# Altium footprint library SMT.PcbLib: 151 footprints (part 1 of 10)
Each footprint in its own frame and in the unit in brackets; x right, y up, seen from the top. Pads: shape width x height; smd on the part's side, far side on the other; paste and mask are expansions set on the pad; w line width, h text height; cw(c..) or ccw(c..) is an arc to the next point about the centre after c.
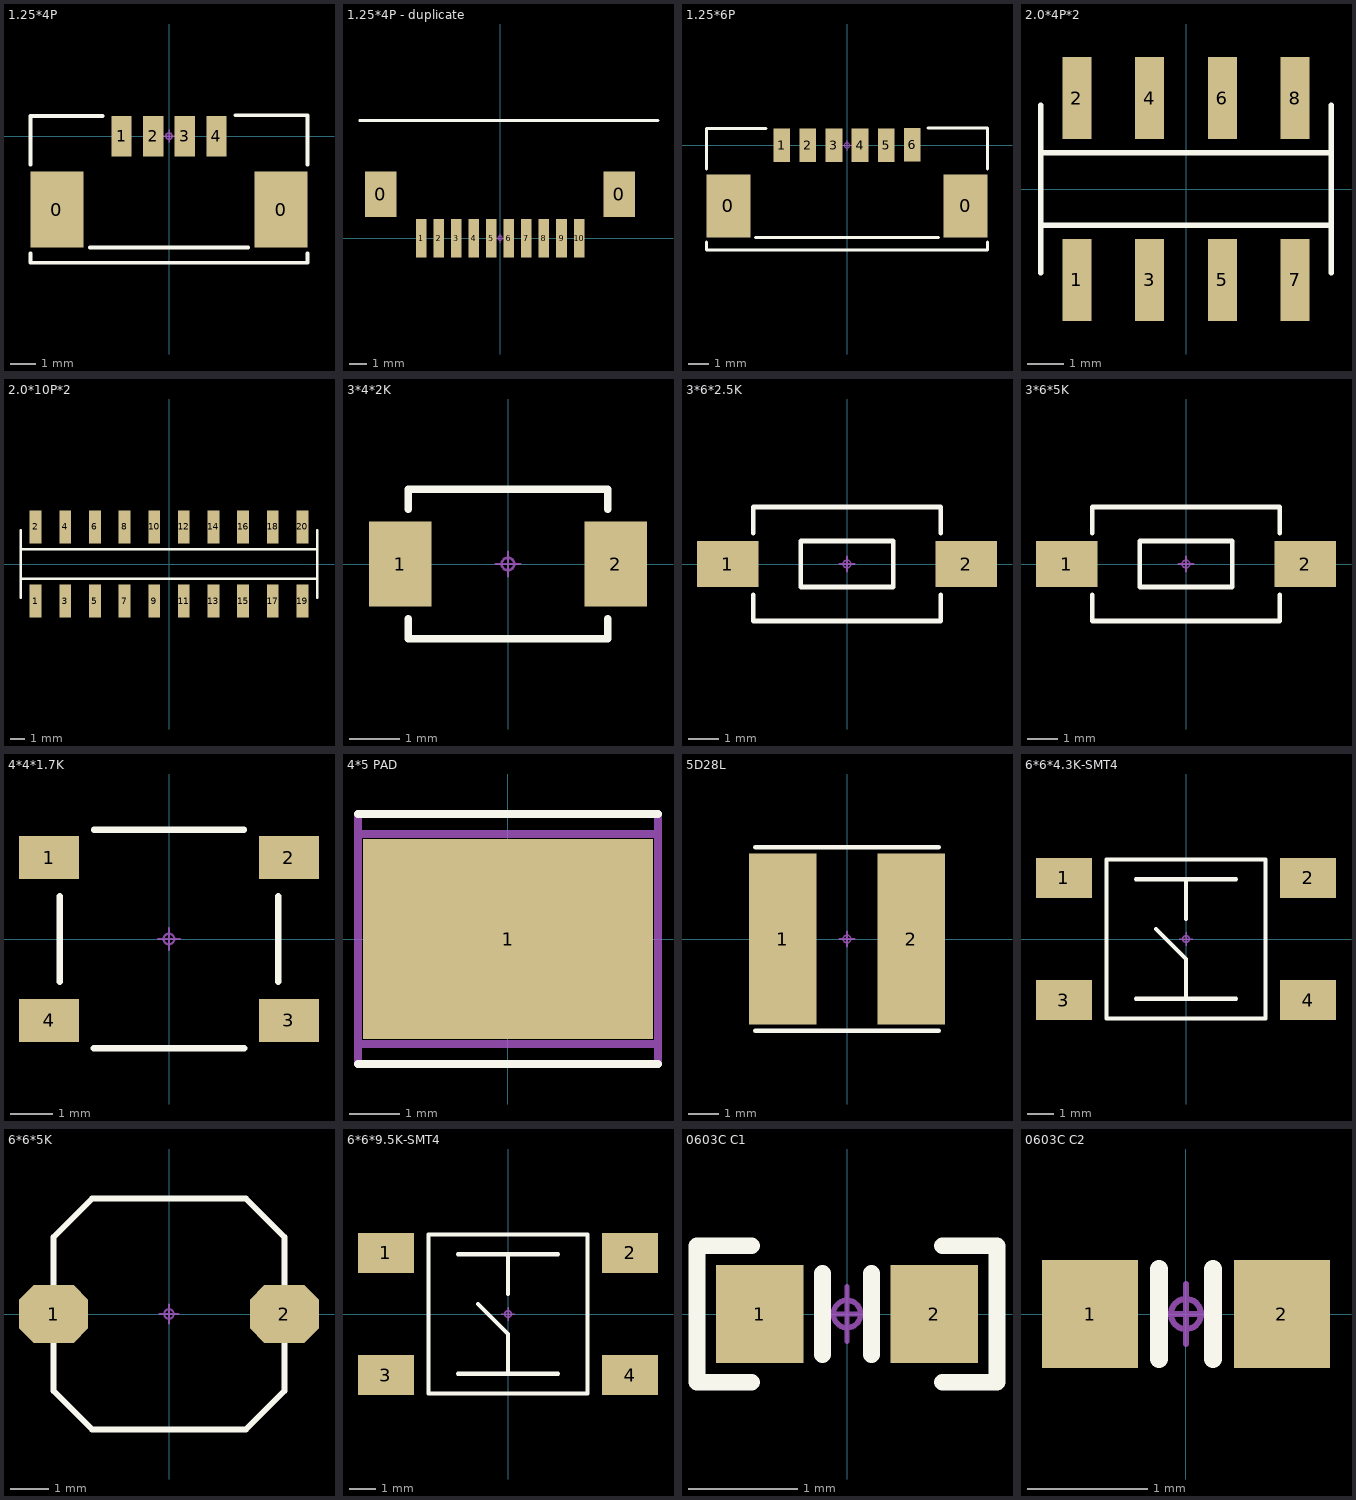
[diagram p0: the footprints below, top view; thin cyan lines are the x and y axes]

## 1.25*4P [mm]
pads (6):
  rect 2.1x3 smd: 0(-4.425,-2.9) 0(4.425,-2.9)
  rect 0.8x1.6 smd: 1(-1.875,0) 2(-0.625,0) 3(0.625,0) 4(1.875,0)
Top Overlay:
  lines w0.152: -5.475,-4.625 -5.475,-5 5.475,-5 5.475,-4.625 ; -5.475,-1.125 -5.475,0.8 -2.625,0.8 ; -3.125,-4.4 3.125,-4.4 ; 2.625,0.825 5.475,0.825 5.475,-1.125
Mechanical 15:
  circle w0.05: c0,0 r0.125
  lines w0.05: -0.25,0 0.25,0 ; 0,-0.25 0,0.25

## 1.25*4P - duplicate [mm]
pads (12):
  rect 1.8x2.6 smd: 0(-6.8,2.5) 0(6.8,2.5)
  rect 0.6x2.2 smd: 1(-4.5,0) 2(-3.5,0) 3(-2.5,0) 4(-1.5,0) 5(-0.5,0) 6(0.5,0) 7(1.5,0) 8(2.5,0) 9(3.5,0) 10(4.5,0)
Top Overlay:
  lines w0.152: -8,6.7 9,6.7
Mechanical 15:
  circle w0.05: c0,0 r0.125
  lines w0.05: -0.25,0 0.25,0 ; 0,-0.25 0,0.25

## 1.25*6P [mm]
pads (8):
  rect 2.1x3 smd: 0(-5.675,-2.9) 0(5.675,-2.9)
  rect 0.8x1.6 smd: 1(-3.125,0) 2(-1.875,0) 3(-0.625,0) 4(0.625,0) 5(1.875,0) 6(3.125,0.025)
Top Overlay:
  lines w0.152: -6.725,-4.625 -6.725,-5 6.725,-5 6.725,-4.625 ; -6.725,-1.125 -6.725,0.8 -3.875,0.8 ; -4.375,-4.4 4.375,-4.4 ; 3.875,0.825 6.725,0.825 6.725,-1.125
Mechanical 15:
  circle w0.05: c0,0 r0.125
  lines w0.05: -0.25,0 0.25,0 ; 0,-0.25 0,0.25

## 2.0*4P*2 [mm]
pads (8):
  rect 0.8x2.25 smd: 1(-3,-2.5) 2(-3,2.5) 3(-1,-2.5) 4(-1,2.5) 5(1,-2.5) 6(1,2.5) 7(3,-2.5) 8(3,2.5)
Top Overlay:
  lines w0.152: -4,-2.3 -4,2.3 ; -4,-1 4,-1 ; -4,1 4,1 ; 4,-2.3 4,2.3

## 2.0*10P*2 [mm]
pads (20):
  rect 0.8x2.25 smd: 1(-9,-2.5) 2(-9,2.5) 3(-7,-2.5) 4(-7,2.5) 5(-5,-2.5) 6(-5,2.5) 7(-3,-2.5) 8(-3,2.5) 9(-1,-2.5) 10(-1,2.5) 11(1,-2.5) 12(1,2.5) 13(3,-2.5) 14(3,2.5) 15(5,-2.5) 16(5,2.5) 17(7,-2.5) 18(7,2.5) 19(9,-2.5) 20(9,2.5)
Top Overlay:
  lines w0.152: -10,-2.3 -10,2.3 ; -10,-1 10,-1 ; -10,1 10,1 ; 10,-2.3 10,2.3

## 3*4*2K [mm]
pads (2):
  rect 1.25x1.7 smd: 1(-2.159,0) 2(2.159,0)
Top Overlay:
  lines w0.152: -2,-1.1 -2,-1.5 2,-1.5 2,-1.1 ; -2,1.1 -2,1.5 2,1.5 2,1.1
Mechanical 15:
  circle w0.05: c0,0 r0.125
  lines w0.05: -0.25,0 0.25,0 ; 0,-0.25 0,0.25
3D body "SW.STEP": height 2, standoff -0.1, extent -2.479,-1.5 2.479,1.5

## 3*6*2.5K [mm]
pads (2):
  rect 2x1.5 smd: 1(-3.875,0) 2(3.875,0)
Top Overlay:
  lines w0.152: -3.05,-1 -3.05,-1.85 3.05,-1.85 3.05,-1 ; -3.05,1 -3.05,1.85 3.05,1.85 3.05,1 ; -1.5,-0.75 1.5,-0.75 1.5,0.75 -1.5,0.75 -1.5,-0.75
Mechanical 15:
  circle w0.05: c0,0 r0.125
  lines w0.05: -0.25,0 0.25,0 ; 0,-0.25 0,0.25
3D body "SMD按键": height 2.5, standoff 0, extent -3.945,-1.89 3.945,1.96

## 3*6*5K [mm]
pads (2):
  rect 2x1.5 smd: 1(-3.875,0) 2(3.875,0)
Top Overlay:
  lines w0.152: -3.05,-1 -3.05,-1.85 3.05,-1.85 3.05,-1 ; -3.05,1 -3.05,1.85 3.05,1.85 3.05,1 ; -1.5,-0.75 1.5,-0.75 1.5,0.75 -1.5,0.75 -1.5,-0.75
Mechanical 15:
  circle w0.05: c0,0 r0.125
  lines w0.05: -0.25,0 0.25,0 ; 0,-0.25 0,0.25
3D body "PB_TYCO_FSMSM.stp": height 4.3, standoff 0, extent -5,-1.75 5,1.75

## 4*4*1.7K [mm]
height 18.5
pads (4):
  rect 1.4x1 smd: 1(-2.8,1.9) 2(2.8,1.9) 3(2.8,-1.9) 4(-2.8,-1.9)
Top Overlay:
  lines w0.15: -2.55,-1 -2.55,1 ; -1.75,2.55 1.75,2.55 ; 2.55,-1 2.55,1
  lines w0.152: -1.75,-2.55 1.75,-2.55
Mechanical 15:
  circle w0.05: c0,0 r0.125
  lines w0.05: -0.25,0 0.25,0 ; 0,-0.25 0,0.25
3D body "alps_4x4x1_7pad.stp": height 0.02, standoff 0, extent -3.5,-2.4 -2.1,-1.4
3D body "alps_4x4x1_7pad.stp": height 0.02, standoff 0, extent -3.5,1.4 -2.1,2.4
3D body "alps_4x4x1_7pad.stp": height 0.02, standoff 0, extent 2.1,-2.4 3.5,-1.4
3D body "alps_4x4x1_7pad.stp": height 0.02, standoff 0, extent 2.1,1.4 3.5,2.4
3D body "apls_4x4x1_7.stp": height 1.22, standoff 0, extent -3.19,-2.5 3.19,2.5

## 4*5 PAD [mm]
pads (1):
  rect 5.8x4 smd: 1(0,0)
Top Overlay:
  lines w0.152: -3,-2.5 3,-2.5 ; -3,2.5 3,2.5
Mechanical 15:
  lines w0.152: -3,-2.5 -3,2.5 ; -3,-2.1 3,-2.1 ; -3,2.1 3,2.1 ; 3,-2.5 3,2.5
3D body "JXDZ.stp": height 9.5, standoff 0, extent -2.5,-2 2.5,2

## 5D28L [mm]
pads (2):
  rect 2.2x5.6 smd: 1(-2.1,0) 2(2.1,0)
Top Overlay:
  lines w0.152: -3,-3 3,-3 ; -3,3 3,3
Mechanical 15:
  circle w0.05: c0,0 r0.125
  lines w0.05: -0.25,0 0.25,0 ; 0,-0.25 0,0.25
3D body "IND_WURTH_WE-TPC-4828.stp": height 2.8, standoff 0, extent -2.4,-2.4 2.4,2.4

## 6*6*4.3K-SMT4 [mm]
pads (4):
  rect 2.1x1.5 smd: 1(-4.6,2.3) 2(4.6,2.3) 3(-4.6,-2.3) 4(4.6,-2.3)
Top Overlay:
  lines w0.152: -1.875,-2.25 1.875,-2.25 ; -1.875,2.25 1.875,2.25 ; -1.125,0.375 0,-0.75 0,-2.25 ; 0,0.75 0,2.25 ; -3,-3 3,-3 3,3 -3,3 -3,-3
Mechanical 15:
  circle w0.05: c0,0 r0.125
  lines w0.05: -0.25,0 0.25,0 ; 0,-0.25 0,0.25
3D body "PB_TYCO_FSM2JSMA.stp": height 4.39, standoff 0, extent -5,-3 5,3

## 6*6*5K [mm]
pads (2):
  oct 1.8x1.5 smd: 1(-3,0) 2(3,0)
Top Overlay:
  lines w0.152: -3,-2 -3,2 -2,3 2,3 3,2 3,-2 2,-3 -2,-3 -3,-2
Mechanical 15:
  circle w0.05: c0,0 r0.125
  lines w0.05: -0.25,0 0.25,0 ; 0,-0.25 0,0.25
3D body "011.stp": height 4.8, standoff -0.05, extent -3.137,-3 3.137,3

## 6*6*9.5K-SMT4 [mm]
pads (4):
  rect 2.1x1.5 smd: 1(-4.6,2.3) 2(4.6,2.3) 3(-4.6,-2.3) 4(4.6,-2.3)
Top Overlay:
  lines w0.152: -1.875,-2.25 1.875,-2.25 ; -1.875,2.25 1.875,2.25 ; -1.125,0.375 0,-0.75 0,-2.25 ; 0,0.75 0,2.25 ; -3,-3 -3,3 3,3 3,-3 -3,-3
Mechanical 15:
  circle w0.05: c0,0 r0.125
  lines w0.05: -0.25,0 0.25,0 ; 0,-0.25 0,0.25
3D body "PB_TYCO_FSM6JSMA.stp": height 7.11, standoff 0, extent -5,-3 5,3

## 0603C C1 [mm]
pads (2):
  rect 0.8x0.9 smd paste-0.02: 1(-0.8,0) 2(0.8,0)
Top Overlay:
  lines w0.152: -0.875,-0.625 -1.375,-0.625 -1.375,0.625 -0.875,0.625 ; -0.225,-0.375 -0.225,0.375 ; 0.225,-0.375 0.225,0.375 ; 0.875,-0.625 1.375,-0.625 1.375,0.625 0.875,0.625
Mechanical 15:
  circle w0.05: c0,0 r0.125
  lines w0.05: -0.25,0 0.25,0 ; 0,-0.25 0,0.25
3D body "CAPC1608X08L.step": height 0.8, standoff 0, extent -0.8,-0.4 0.8,0.4

## 0603C C2 [mm]
pads (2):
  rect 0.8x0.9 smd paste-0.02: 1(-0.8,0) 2(0.8,0)
Top Overlay:
  lines w0.152: -0.225,-0.375 -0.225,0.375 ; 0.225,-0.375 0.225,0.375
Mechanical 15:
  circle w0.05: c0,0 r0.125
  lines w0.05: -0.25,0 0.25,0 ; 0,-0.25 0,0.25
3D body "CAPC1608X08L.step": height 0.8, standoff 0, extent -0.8,-0.4 0.8,0.4